# Altium footprint library LukaLIBRARY.PcbLib: 784 footprints (part 47 of 49)
Each footprint in its own frame and in the unit in brackets; x right, y up, seen from the top. Pads: shape width x height; smd on the part's side, far side on the other; paste and mask are expansions set on the pad; w line width, h text height; cw(c..) or ccw(c..) is an arc to the next point about the centre after c.
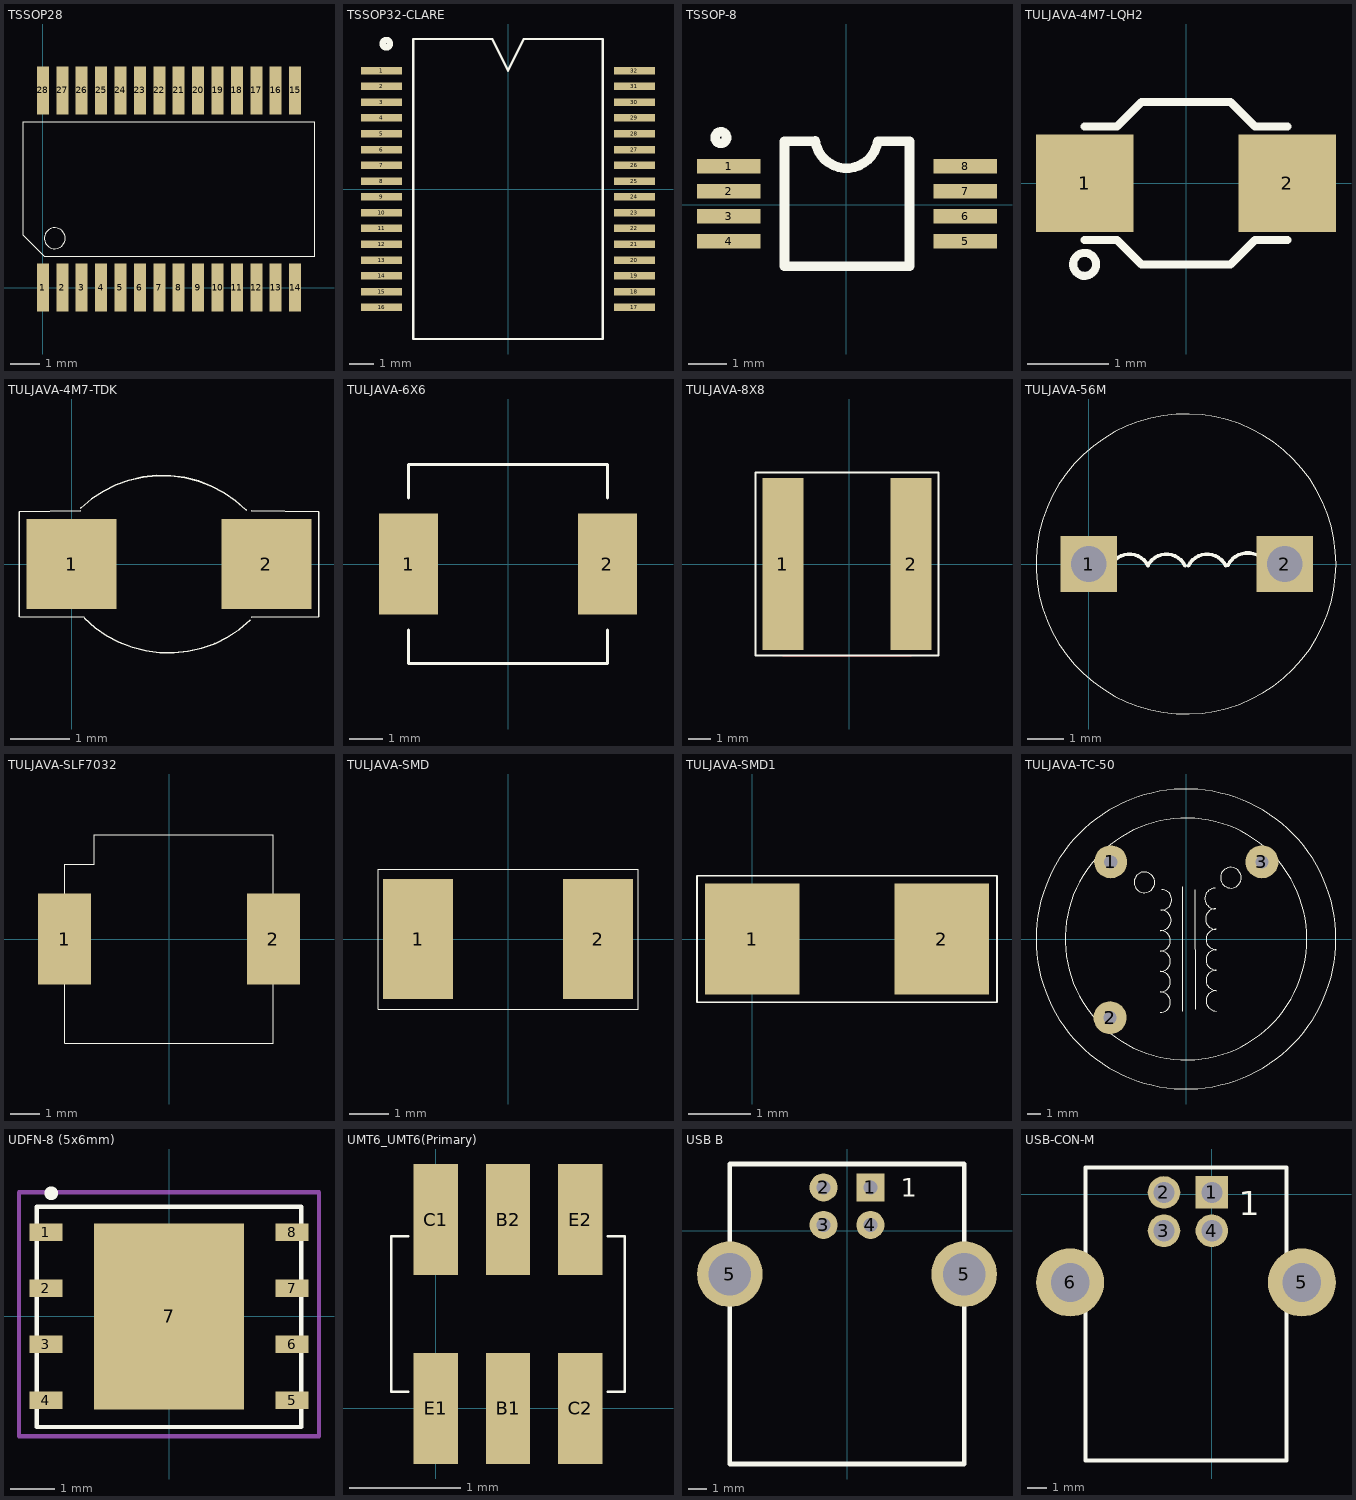
[diagram p46: the footprints below, top view; thin cyan lines are the x and y axes]

## TSSOP28 [mm]
pads (28):
  rect 0.4x1.6 smd: 1(0,0) 2(0.65,0) 3(1.3,0) 4(1.95,0) 5(2.6,0) 6(3.25,0) 7(3.9,0) 8(4.55,0) 9(5.2,0) 10(5.85,0) 11(6.5,0) 12(7.15,0) 13(7.8,0) 14(8.45,0) 15(8.45,6.6) 16(7.8,6.6) 17(7.15,6.6) 18(6.5,6.6) 19(5.85,6.6) 20(5.2,6.6) 21(4.55,6.6) 22(3.9,6.6) 23(3.25,6.6) 24(2.6,6.6) 25(1.95,6.6) 26(1.3,6.6) 27(0.65,6.6) 28(0,6.6)
Top Overlay:
  circle w0.025: c0.4,1.65 r0.35
  lines w0.025: -0.65,1.75 -0.65,5.55 9.1,5.55 9.1,1.05 0.05,1.05 -0.65,1.75

## TSSOP32-CLARE [mm]
pads (32):
  rect 1.65x0.3 smd: 1(-5.08,4.775) 2(-5.08,4.14) 3(-5.08,3.505) 4(-5.08,2.87) 5(-5.08,2.235) 6(-5.08,1.6) 7(-5.08,0.965) 8(-5.08,0.33) 9(-5.08,-0.305) 10(-5.08,-0.94) 11(-5.08,-1.575) 12(-5.08,-2.21) 13(-5.08,-2.845) 14(-5.08,-3.48) 15(-5.08,-4.115) 16(-5.08,-4.75) 17(5.08,-4.75) 18(5.08,-4.115) 19(5.08,-3.48) 20(5.08,-2.845) 21(5.08,-2.21) 22(5.08,-1.575) 23(5.08,-0.94) 24(5.08,-0.305) 25(5.08,0.33) 26(5.08,0.965) 27(5.08,1.6) 28(5.08,2.235) 29(5.08,2.87) 30(5.08,3.505) 31(5.08,4.14) 32(5.08,4.775)
Top Overlay:
  circle w0.25: c-4.895,5.855 r0.15
  lines w0.1: -3.81,-6.02 3.81,-6.02 3.81,6.045 0.635,6.045 0,4.775 -0.635,6.045 -3.81,6.045 -3.81,-6.02

## TSSOP-8 [mm]
pads (8):
  rect 1.65x0.381 smd: 1(-3.05,1) 2(-3.05,0.35) 3(-3.05,-0.3) 4(-3.05,-0.95) 5(3.1,-0.95) 6(3.1,-0.3) 7(3.1,0.35) 8(3.1,1)
Top Overlay:
  circle w0.25: c-3.255,1.745 r0.15
  lines w0.25: -0.85,1.65 -1.6,1.65 -1.6,-1.6 1.65,-1.6 1.65,1.65 ; -0.803,1.657 ccw(c0.01,1.77) 0.823,1.654 ; 0.85,1.65 1.6,1.65

## TULJAVA-4M7-LQH2 [mm]
pads (2):
  rect 1.2x1.2 smd mask-25.4: 1(-1.25,0) 2(1.25,0)
Top Overlay:
  circle w0.1: c-1.25,-1 r0.141
  lines w0.1: -1.25,-0.7 -0.85,-0.7 -0.55,-1 0.55,-1 0.85,-0.7 1.25,-0.7 ; -1.25,0.7 -0.85,0.7 -0.55,1 0.55,1 0.85,0.7 1.25,0.7
Top Solder:
  region: 0.65,-0.6 1.85,-0.6 1.85,0.6 0.65,0.6
  region: -1.85,-0.6 -0.65,-0.6 -0.65,0.6 -1.85,0.6

## TULJAVA-4M7-TDK [mil]
pads (2):
  rect 60x60 smd mask-1000: 1(0,0) 2(130,0)
Top Overlay:
  lines w1: -35,-35 -35,35 ; -34.69,35 6.3,35.43 ; -34.65,-35.04 8.66,-35.43 ; 119.69,-35.43 165,-35 165,35 119.69,35.43
  lines w1.06: 6.26,37.41 cw(c60.63,-19.68) 116.38,36.06 ; 8.71,-36.17 ccw(c64.57,19.68) 119.04,-37.52
Top Solder:
  region: -30,-30 30,-30 30,30 -30,30
  region: 100,-30 160,-30 160,30 100,30

## TULJAVA-6X6 [mil]
pads (2):
  rect 70x120 smd: 1(-118.11,0) 2(118.11,0)
Top Overlay:
  lines w3.94: -118.11,-78.74 -118.11,-118.11 118.11,-118.11 118.11,-78.74 ; -118.11,78.74 -118.11,118.11 118.11,118.11 118.11,78.74

## TULJAVA-8X8 [mm]
pads (2):
  rect 1.8x7.5 smd mask-25.4: 1(-2.9,0) 2(2.7,0)
Top Layer:
  lines w0.001: -2.9,-4 2.7,-4
Top Overlay:
  lines w0.1: -4.1,-4 -4.1,4 3.9,4 3.9,-4 -2.9,-4 -4.1,-4
Top Solder:
  region: 1.8,-3.75 3.6,-3.75 3.6,3.75 1.8,3.75
  region: -3.8,-3.75 -2,-3.75 -2,3.75 -3.8,3.75

## TULJAVA-56M [mil]
pads (2):
  rect 60x60 hole 38 mask-1000: 1(0,0) 2(208.66,0)
Top Overlay:
  circle w1: c103.54,0 r159.65
  lines w3.94: 23.39,-1.84 cw(c43.31,-11.81) 63.22,-1.84 ; 62.76,-1.84 cw(c82.68,-11.81) 102.59,-1.84 ; 106.07,-1.84 cw(c125.98,-11.81) 145.9,-1.84 ; 148.17,-1.23 cw(c169.29,-11.81) 190.41,-1.23
Top Solder:
  region: 178.66,-30 238.66,-30 238.66,30 178.66,30
  region: -30,-30 30,-30 30,30 -30,30
Bottom Solder:
  region: 178.66,-30 238.66,-30 238.66,30 178.66,30
  region: -30,-30 30,-30 30,30 -30,30

## TULJAVA-SLF7032 [mil]
pads (2):
  rect 70x120 smd mask-1000: 1(-137.8,0) 2(137.8,0)
Top Overlay:
  lines w1.18: -137.8,-59.06 -137.8,-137.8 137.8,-137.8 137.8,-59.06 ; -137.8,59.06 -137.8,98.43 -98.43,98.43 -98.43,137.8 137.8,137.8 137.8,59.06
Top Solder:
  region: -172.8,-60 -102.8,-60 -102.8,60 -172.8,60
  region: 102.8,-60 172.8,-60 172.8,60 102.8,60

## TULJAVA-SMD [mil]
pads (2):
  rect 70x120 smd: 1(-90,0) 2(90,0)
Top Overlay:
  lines w1: -130,-70 130,-70 130,70 -130,70 -130,-70

## TULJAVA-SMD1 [mil]
pads (2):
  rect 60x70 smd mask-1000: 1(0,0) 2(120,0)
Top Overlay:
  lines w1: -35,-40 -35,40 155,40 155,-40 -35,-40
Top Solder:
  region: -30,-35 30,-35 30,35 -30,35
  region: 90,-35 150,-35 150,35 90,35

## TULJAVA-TC-50 [mm]
pads (3):
  round 2.5 hole 1 unplated mask-25.4: 1(-5.7,5.85) 2(-5.75,-5.95) 3(5.75,5.85)
Top Overlay:
  circle w0.01: c0,0.01 r9.158
  circle w0.01: c0,0.01 r11.359
  circle w0.03: c3.4,4.65 r0.781
  circle w0.03: c-3.15,4.3 r0.781
  lines w0.01: -1.95,-5.55 ccw(c-1.95,-4.775) -1.95,-4 ccw(c-1.95,-3.225) -1.95,-2.45 ccw(c-1.95,-1.675) -1.95,-0.9 ccw(c-1.95,-0.125) -1.95,0.65 ; -1.9,0.65 ccw(c-1.9,1.425) -1.9,2.2 ; -1.85,2.2 ccw(c-1.85,2.975) -1.85,3.75 ; 2.2,2.3 cw(c2.2,3.075) 2.2,3.85 ; 2.25,0.75 cw(c2.25,1.525) 2.25,2.3 ; 2.3,-5.45 cw(c2.3,-4.675) 2.3,-3.9 cw(c2.3,-3.125) 2.3,-2.35 cw(c2.3,-1.575) 2.3,-0.8 cw(c2.3,-0.025) 2.3,0.75
  lines w0.03: -0.25,-5.45 -0.25,3.95 ; 0.65,3.75 0.7,-5.3
Top Solder:
  region: -7,-7.2 -4.5,-7.2 -4.5,-4.7 -7,-4.7
  region: 4.5,4.6 7,4.6 7,7.1 4.5,7.1
  region: -6.95,4.6 -4.45,4.6 -4.45,7.1 -6.95,7.1
Bottom Solder:
  region: -7,-7.2 -4.5,-7.2 -4.5,-4.7 -7,-4.7
  region: 4.5,4.6 7,4.6 7,7.1 4.5,7.1
  region: -6.95,4.6 -4.45,4.6 -4.45,7.1 -6.95,7.1

## UDFN-8 (5x6mm) [mm]
pads (9):
  rect 0.75x0.4 smd: 1(-2.794,1.905) 2(-2.794,0.635) 3(-2.794,-0.635) 4(-2.794,-1.905) 5(2.794,-1.905) 6(2.794,-0.635) 7(2.794,0.635) 8(2.794,1.905)
  rect 3.4x4.216 smd: 7(0,0)
Top Overlay:
  circle w0.25: c-2.672,2.794 r0.03
  lines w0.1: -2.997,-2.511 -2.997,2.489 3.003,2.489 3.003,-2.511 -2.997,-2.511
Mechanical 15:
  lines w0.1: -3.404,-2.718 3.404,-2.718 3.404,2.819 -3.404,2.819 -3.404,-2.718

## UMT6_UMT6(Primary) [mm]
pads (6):
  rect 0.4x1 smd mask-25.4: B1(0.65,0) B2(0.65,1.7) C1(0,1.7) C2(1.3,0) E1(0,0) E2(1.3,1.7)
Top Overlay:
  lines w0.025: -0.25,0.15 -0.4,0.15 -0.4,1.55 -0.25,1.55 ; 1.55,0.15 1.7,0.15 1.7,1.55 1.55,1.55
Top Solder:
  region: -0.2,-0.5 0.2,-0.5 0.2,0.5 -0.2,0.5
  region: -0.2,1.2 0.2,1.2 0.2,2.2 -0.2,2.2
  region: 1.1,-0.5 1.5,-0.5 1.5,0.5 1.1,0.5
  region: 0.45,-0.5 0.85,-0.5 0.85,0.5 0.45,0.5
  region: 1.1,1.2 1.5,1.2 1.5,2.2 1.1,2.2
  region: 0.45,1.2 0.85,1.2 0.85,2.2 0.45,2.2

## USB B [mil]
pads (6):
  rect 60x60 hole 30: 1(50,92.5)
  round 60 hole 30: 2(-50,92.5) 3(-50,12.5) 4(50,12.5)
  round 140 hole 90: 5(-250,-92.5) 5(250,-92.5)
Top Overlay:
  lines w10: -250,-497.5 -250,142.5 250,142.5 250,-497.5 -250,-497.5
  text "1" at 114.17,72.83 h39.37

## USB-CON-M [mm]
pads (6):
  rect 1.7x1.7 hole 1.1: 1(0,0.1)
  round 1.7 hole 1.1: 2(-2.5,0.1) 3(-2.5,-1.9) 4(0,-1.9)
  round 3.556 hole 2.032 mask-25.4: 5(4.7,-4.6) 6(-7.4,-4.6)
Top Overlay:
  lines w0.2: -6.6,-13.9 3.9,-13.9 3.9,1.4 -6.6,1.4 -6.6,-13.9
  text "1" at 1.4,-1.1 h1.25
Top Solder:
  region: 4.7,-2.813 4.351,-2.848 4.016,-2.949 3.707,-3.114 3.437,-3.337 3.214,-3.607 3.049,-3.916 2.948,-4.251 2.913,-4.6 2.948,-4.949 3.049,-5.284 3.214,-5.593 3.437,-5.863 3.707,-6.086 4.016,-6.251 4.351,-6.352 4.7,-6.387 5.049,-6.352 5.384,-6.251 5.693,-6.086 5.963,-5.863 6.186,-5.593 6.351,-5.284 6.452,-4.949 6.487,-4.6 6.452,-4.251 6.351,-3.916 6.186,-3.607 5.963,-3.337 5.693,-3.114 5.384,-2.949 5.049,-2.848
  region: -7.4,-2.813 -7.749,-2.848 -8.084,-2.949 -8.393,-3.114 -8.663,-3.337 -8.886,-3.607 -9.051,-3.916 -9.152,-4.251 -9.187,-4.6 -9.152,-4.949 -9.051,-5.284 -8.886,-5.593 -8.663,-5.863 -8.393,-6.086 -8.084,-6.251 -7.749,-6.352 -7.4,-6.387 -7.051,-6.352 -6.716,-6.251 -6.407,-6.086 -6.137,-5.863 -5.914,-5.593 -5.749,-5.284 -5.648,-4.949 -5.613,-4.6 -5.648,-4.251 -5.749,-3.916 -5.914,-3.607 -6.137,-3.337 -6.407,-3.114 -6.716,-2.949 -7.051,-2.848
Bottom Solder:
  region: 4.7,-2.813 4.351,-2.848 4.016,-2.949 3.707,-3.114 3.437,-3.337 3.214,-3.607 3.049,-3.916 2.948,-4.251 2.913,-4.6 2.948,-4.949 3.049,-5.284 3.214,-5.593 3.437,-5.863 3.707,-6.086 4.016,-6.251 4.351,-6.352 4.7,-6.387 5.049,-6.352 5.384,-6.251 5.693,-6.086 5.963,-5.863 6.186,-5.593 6.351,-5.284 6.452,-4.949 6.487,-4.6 6.452,-4.251 6.351,-3.916 6.186,-3.607 5.963,-3.337 5.693,-3.114 5.384,-2.949 5.049,-2.848
  region: -7.4,-2.813 -7.749,-2.848 -8.084,-2.949 -8.393,-3.114 -8.663,-3.337 -8.886,-3.607 -9.051,-3.916 -9.152,-4.251 -9.187,-4.6 -9.152,-4.949 -9.051,-5.284 -8.886,-5.593 -8.663,-5.863 -8.393,-6.086 -8.084,-6.251 -7.749,-6.352 -7.4,-6.387 -7.051,-6.352 -6.716,-6.251 -6.407,-6.086 -6.137,-5.863 -5.914,-5.593 -5.749,-5.284 -5.648,-4.949 -5.613,-4.6 -5.648,-4.251 -5.749,-3.916 -5.914,-3.607 -6.137,-3.337 -6.407,-3.114 -6.716,-2.949 -7.051,-2.848